# Altium footprint library PLC1.PcbLib: 118 footprints (part 5 of 8)
Each footprint in its own frame and in the unit in brackets; x right, y up, seen from the top. Pads: shape width x height; smd on the part's side, far side on the other; paste and mask are expansions set on the pad; w line width, h text height; cw(c..) or ccw(c..) is an arc to the next point about the centre after c.
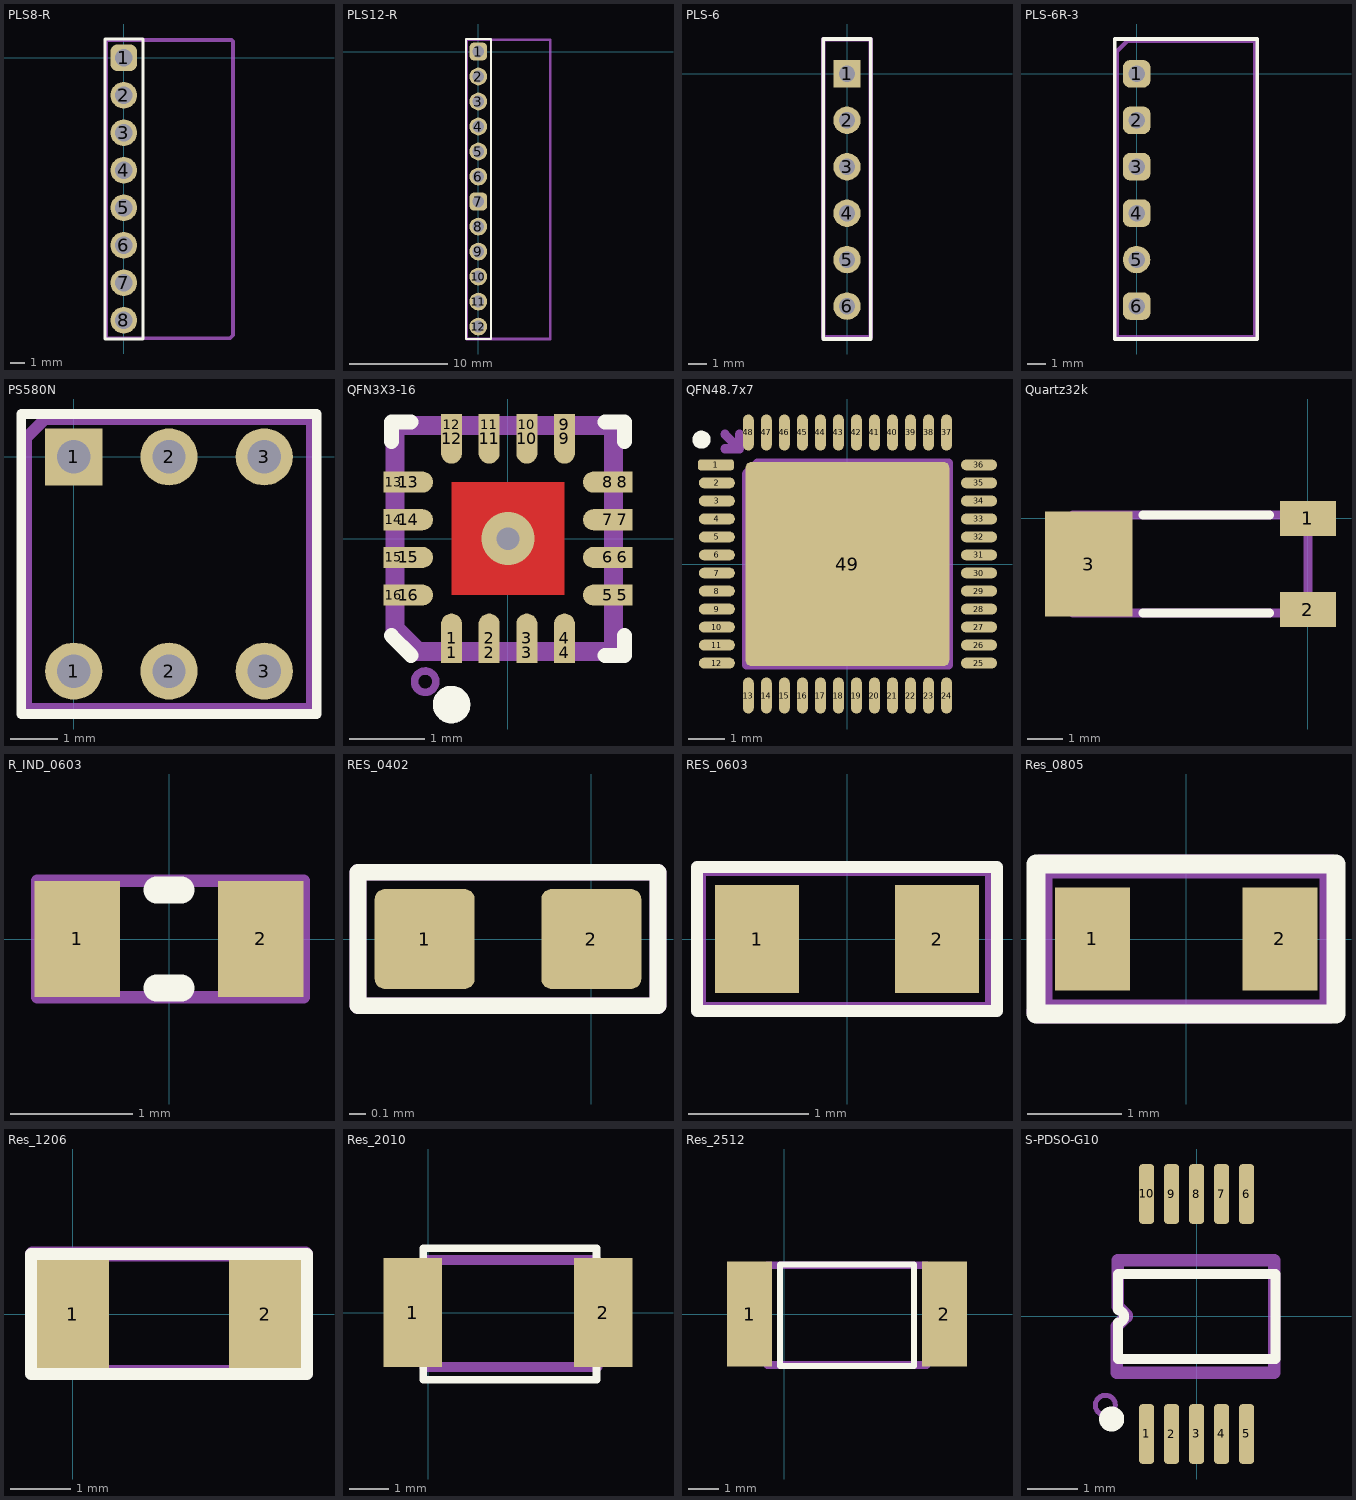
[diagram p4: the footprints below, top view; thin cyan lines are the x and y axes]

## PLS8-R [mm] "PLS8-R"
height 5
pads (8):
  rrect50% 1.8x1.8 hole 1.2: 1(0,0)
  round 1.8 hole 1.2: 2(0,-2.54) 3(0,-5.08) 4(0,-7.62) 5(0,-10.16) 6(0,-12.7) 7(0,-15.24) 8(0,-17.78)
Top Overlay:
  lines w0.2: -1.27,-19.05 1.3,-19.05 1.3,1.27 -1.27,1.27 -1.27,-19.05
Top Assy:
  lines w0.254: -1.2,-19 -1.2,1.2 7.3,1.2 7.4,1.1 7.4,-18.8 7.2,-19 -1.2,-19
  text ".Designator" at 0.3,-13.4 h0.7
3D body "User Library-PLS-1R.step": height 5.45, standoff -3, extent -1.27,-11.43 7.35,-8.89
3D body "User Library-PLS-1R.step": height 5.45, standoff -3, extent -1.27,-13.98 7.35,-11.44
3D body "User Library-PLS-1R.step": height 5.45, standoff -3, extent -1.27,-8.9 7.35,-6.36
3D body "User Library-PLS-1R.step": height 5.45, standoff -3, extent -1.27,-6.35 7.35,-3.81
3D body "User Library-PLS-1R.step": height 5.45, standoff -3, extent -1.27,-1.27 7.35,1.27
3D body "User Library-PLS-1R.step": height 5.45, standoff -3, extent -1.27,-3.82 7.35,-1.28
3D body "User Library-PLS-1R.step": height 5.45, standoff -3, extent -1.27,-19.06 7.35,-16.52
3D body "User Library-PLS-1R.step": height 5.45, standoff -3, extent -1.27,-16.51 7.35,-13.97

## PLS12-R [mm] "PLS12-R"
height 5
pads (12):
  rrect50% 1.8x1.8 hole 1.2: 1(0,0) 7(0,-15.24)
  round 1.8 hole 1.2: 2(0,-2.54) 3(0,-5.08) 4(0,-7.62) 5(0,-10.16) 6(0,-12.7) 8(0,-17.78) 9(0,-20.32) 10(0,-22.86) 11(0,-25.4) 12(0,-27.94)
Top Overlay:
  lines w0.2: -1.27,-29.2 1.3,-29.2 1.3,1.27 -1.27,1.27 -1.27,-29.2
Top Assy:
  lines w0.254: -1.2,-29.2 -1.2,1.2 7.3,1.2 7.3,-29.2 -1.2,-29.2
  text ".Designator" at 0.2,-9.3 h0.7
3D body "User Library-PLS-1R.step": height 5.45, standoff -3, extent -1.27,-11.43 7.35,-8.89
3D body "User Library-PLS-1R.step": height 5.45, standoff -3, extent -1.27,-13.98 7.35,-11.44
3D body "User Library-PLS-1R.step": height 5.45, standoff -3, extent -1.27,-8.9 7.35,-6.36
3D body "User Library-PLS-1R.step": height 5.45, standoff -3, extent -1.27,-6.35 7.35,-3.81
3D body "User Library-PLS-1R.step": height 5.45, standoff -3, extent -1.27,-1.27 7.35,1.27
3D body "User Library-PLS-1R.step": height 5.45, standoff -3, extent -1.27,-3.82 7.35,-1.28
3D body "User Library-PLS-1R.step": height 5.45, standoff -3, extent -1.27,-19.06 7.35,-16.52
3D body "User Library-PLS-1R.step": height 5.45, standoff -3, extent -1.27,-16.51 7.35,-13.97
3D body "User Library-PLS-1R.step": height 5.45, standoff -3, extent -1.27,-21.59 7.35,-19.05
3D body "User Library-PLS-1R.step": height 5.45, standoff -3, extent -1.27,-24.14 7.35,-21.6
3D body "User Library-PLS-1R.step": height 5.45, standoff -3, extent -1.27,-29.22 7.35,-26.68
3D body "User Library-PLS-1R.step": height 5.45, standoff -3, extent -1.27,-26.67 7.35,-24.13

## PLS-6 [mm] "PLS connector"
pads (6):
  rect 1.5x1.5 hole 0.9: 1(0,0)
  round 1.5 hole 0.9: 2(0,-2.54) 3(0,-5.08) 4(0,-7.62) 5(0,-10.16) 6(0,-12.7)
Top Overlay:
  lines w0.2: -1.3,-14.5 1.3,-14.5 1.3,-10.399 1.3,-2.196 1.3,1.905 -1.3,1.905 -1.3,-14.5
Top Assy:
  lines w0.254: -1.3,-14.4 1.3,-14.4 1.3,1.9 -1.3,1.9 -1.3,-14.4
  text ".Designator" at 0.5,-11.8 h0.7

## PLS-6R-3 [mm] "PLS connector"
pads (6):
  rrect50% 1.5x1.5 hole 0.9: 1(0,0) 2(0,-2.54) 3(0,-5.08) 4(0,-7.62) 6(0,-12.7)
  round 1.5 hole 0.9: 5(0,-10.16)
Top Overlay:
  lines w0.2: -1.2,-14.5 -1.2,1.905 6.6,1.905 6.6,-14.5 -1.2,-14.5
Top Assy:
  lines w0.254: -1.1,-14.4 6.5,-14.4 6.5,1.7 6.4,1.8 -0.5,1.8 -1.1,1.2 -1.1,-14.4
  text ".Designator" at 0.3,-9.9 h0.7

## PS580N [mm] "button"
pads (6):
  round 1.2 hole 0.7: 1(0,-4.5) 2(2,-4.5) 2(2,0) 3(4,-4.5) 3(4,0)
  rect 1.2x1.2 hole 0.7: 1(0,0)
Top Overlay:
  lines w0.2: -1.1,-5.4 -1.1,0.9 5.1,0.9 5.1,-5.4 -1.1,-5.4
Top Assy:
  lines w0.254: -1,-5.3 -1,0.4 -0.6,0.8 5,0.8 5,-5.3 -1,-5.3
  text ".Designator" at -0.4,-2.5 h0.7

## QFN3X3-16 [mm] "Quad Flat No Lead, Plastic; 16 Terminals; Body 3 x 3 mm; Pitch 0.5 mm"
height 0.8
pads (32):
  rect 0.28x0.28 smd: 1(-0.75,-1.515) 2(-0.25,-1.515) 3(0.25,-1.515) 4(0.75,-1.515) 5(1.515,-0.75) 6(1.515,-0.25) 7(1.515,0.25) 8(1.515,0.75) 9(0.75,1.515) 10(0.25,1.515) 11(-0.25,1.515) 12(-0.75,1.515) 13(-1.515,0.75) 14(-1.515,0.25) 15(-1.515,-0.25) 16(-1.515,-0.75)
  oval 0.28x0.66 smd: 1(-0.75,-1.325) 2(-0.25,-1.325) 3(0.25,-1.325) 4(0.75,-1.325) 9(0.75,1.325) 10(0.25,1.325) 11(-0.25,1.325) 12(-0.75,1.325)
  oval 0.66x0.28 smd: 5(1.325,-0.75) 6(1.325,-0.25) 7(1.325,0.25) 8(1.325,0.75) 13(-1.325,0.75) 14(-1.325,0.25) 15(-1.325,-0.25) 16(-1.325,-0.75)
via 0,0 diameter 0.7 hole 0.3
Top Layer:
  rectangle: -0.75,-0.75 0.75,0.75
Top Overlay:
  circle w0.25: c-0.75,-2.205 r0.125
  lines w0.2: -1.55,-1.29 -1.29,-1.55 ; -1.55,1.29 -1.55,1.55 -1.29,1.55 ; 1.29,-1.55 1.55,-1.55 1.55,-1.29 ; 1.29,1.55 1.55,1.55 1.55,1.29
Top Solder:
  region: -0.8,0.8 -0.8,-0.8 0.8,-0.8 0.8,0.8
Top Assy:
  circle w0.1: c-1.1,-1.9 r0.141
  lines w0.254: 1.4,-1.5 1.4,1.5 -1.5,1.5 -1.5,-1.2 -1.2,-1.5 1.5,-1.5
  text ".Designator" at -1.3,-0.3 h0.7
3D body "User Library-QFN-16_3x3.STEP": height 0.9, standoff 0, extent -1.524,-1.521 1.518,1.521

## QFN48.7x7 [mm] "48-Pin Thin Quad Flat Pack 0.5 mm Pitch, IPC Medium Density"
height 1.6
pads (49):
  rrect50% 1x0.3 smd: 1(-3.65,2.75)
  oval 1x0.3 smd: 2(-3.625,2.25) 3(-3.625,1.75) 4(-3.625,1.25) 5(-3.625,0.75) 6(-3.625,0.25) 7(-3.625,-0.25) 8(-3.625,-0.75) 9(-3.625,-1.25) 10(-3.625,-1.75) 11(-3.625,-2.25) 12(-3.625,-2.75) 25(3.65,-2.75) 26(3.65,-2.25) 27(3.65,-1.75) 28(3.65,-1.25) 29(3.65,-0.75) 30(3.65,-0.25) 31(3.65,0.25) 32(3.65,0.75) 33(3.65,1.25) 34(3.65,1.75) 35(3.65,2.25) 36(3.65,2.75)
  oval 0.3x1 smd: 13(-2.75,-3.65) 14(-2.25,-3.65) 15(-1.75,-3.65) 16(-1.25,-3.65) 17(-0.75,-3.65) 18(-0.25,-3.65) 19(0.25,-3.65) 20(0.75,-3.65) 21(1.25,-3.65) 22(1.75,-3.65) 23(2.25,-3.65) 24(2.75,-3.65) 37(2.75,3.65) 38(2.25,3.65) 39(1.75,3.65) 40(1.25,3.65) 41(0.75,3.65) 42(0.25,3.65) 43(-0.25,3.65) 44(-0.75,3.65) 45(-1.25,3.65) 46(-1.75,3.65) 47(-2.25,3.65) 48(-2.75,3.65)
  rrect5% 5.65x5.65 smd: 49(0,0)
Top Overlay:
  circle w0.25: c-4.05,3.45 r0.125
Top Assy:
  lines w0.254: -3.4,3.2 -3,3.2 ; -3.4,3.6 -3,3.2 ; -3,3.6 -3,3.2 ; -2.8,-2.8 -2.8,2.5 -2.5,2.8 2.8,2.8 2.8,-2.8 -2.8,-2.8
  text ".Designator" at -2.5,-0.2 h0.7
3D body "User Library-QFN48-1.STEP": height 0.83, standoff -0.02, extent -3.5,-3.505 3.51,3.5

## Quartz32k [mm] "Resonator 32kHz"
height 3
pads (3):
  rect 1.6x1 smd: 1(0,0) 2(0,-2.6)
  rect 2.5x3 smd: 3(-6.25,-1.3)
Top Overlay:
  lines w0.254: -4.7,-2.7 -1.1,-2.7 ; -4.7,0.1 -1.1,0.1
Top Assy:
  lines w0.254: -6.7,-2.7 -6.7,0.1 -0.1,0.1 0,0 0,-2.7 -6.7,-2.7
  text ".Designator" at -6.2,-1.6 h0.7

## R_IND_0603 [mm] "Chip, Body 1.6x0.85mm, IPC High Density"
height 0.8
pads (2):
  rect 0.7x0.95 smd mask+0.05: 1(-0.75,0) 2(0.75,0)
Top Overlay:
  lines w0.22: -0.1,-0.4 0.1,-0.4 ; -0.1,0.4 0.1,0.4
Top Assy:
  lines w0.1: -1.075,-0.475 0.075,-0.475 1.1,-0.475 1.1,0.475 -0.05,0.475 -1.075,0.475 -1.075,-0.475
  text ".Designator" at -0.95,-0.35 h0.7
3D body "RES0603.stp": height 0.45, standoff 0, extent -0.8,-0.4 0.8,0.4

## RES_0402 [mm] "RES and IND"
height 0.5
pads (2):
  rrect20% 0.6x0.6 smd: 1(-1,0) 2(0,0)
Top Overlay:
  lines w0.1: -1.4,-0.4 0.4,-0.4 0.4,0.4 -1.4,0.4 -1.4,-0.4
Top Assy:
  lines w0.1: -1.4,-0.4 0.4,-0.4 0.4,0.4 -1.4,0.4 -1.4,-0.4
  text ".Designator" at -1.3,-0.35 h0.7
3D body "User Library-res0402-1.step": height 0.3, standoff 0, extent -1,-0.25 0,0.25

## RES_0603 [mm] "RES and IND"
height 0.5
pads (2):
  rect 0.7x0.9 smd: 1(-0.75,0) 2(0.75,0)
Top Overlay:
  lines w0.1: -1.25,-0.6 -1.25,0.6 1.25,0.6 1.25,-0.6 -1.25,-0.6
Top Assy:
  lines w0.1: -1.225,-0.575 1.2,-0.575 1.2,0.575 -1.225,0.575 -1.225,-0.575
  text ".Designator" at -1.075,-0.35 h0.7
3D body "User Library-RES_1609-0603.STEP": height 0.56, standoff 0, extent -0.85,-0.4 0.85,0.4

## Res_0805 [mm]
pads (2):
  rect 0.8x1.1 smd: 1(-1,0) 2(1,0)
Top Overlay:
  lines w0.2: -1.6,-0.8 1.6,-0.8 1.6,0.8 -1.6,0.8 -1.6,-0.117 -1.6,-0.8
Top Assy:
  lines w0.254: 1.55,0.775 -1.55,0.775 -1.55,-0.75 -1.575,-0.775 1.525,-0.775 1.55,-0.75 1.55,0.775 ; 1.55,0.775 1.55,0.775
  text ".Designator" at -1.325,-0.4 h0.7
3D body "User Library-R_0805.step": height 0.5, standoff 0, extent -1,-0.625 1,0.625

## Res_1206 [mm]
pads (2):
  rect 1.2x1.8 smd: 1(0,0) 2(3.2,0)
Top Overlay:
  lines w0.2: -0.7,-1 3.9,-1 3.9,1 1.975,1 -0.7,1 -0.7,-1
Top Assy:
  lines w0.254: -0.675,-0.95 -0.675,1 3.875,1 3.875,-0.975 -0.65,-0.975 -0.675,-0.95
  text ".Designator" at -0.375,-0.375 h0.7
3D body "User Library-RES_3216-1206.step": height 0.85, standoff 0, extent -0.075,-0.865 3.275,0.865

## Res_2010 [mm] "2010"
height 2
pads (2):
  rect 1.5x2.8 smd: 1(-0.4,0) 2(4.5,0)
Top Overlay:
  lines w0.2: -0.125,-1.725 4.325,-1.725 4.325,1.65 2.625,1.65 -0.125,1.65 -0.125,-1.725
Top Assy:
  lines w0.254: -0.1,-1.4 -0.1,1.35 4.325,1.35 4.35,1.325 4.35,-1.4 -0.05,-1.4
  text ".Designator" at 0.175,-0.4 h0.7
3D body "User Library-R_2010.step": height 0.6, standoff 0, extent -0.5,-1.25 4.5,1.25

## Res_2512 [mm] "2512"
height 2
pads (2):
  rect 1.5x3.5 smd: 1(-1.15,0) 2(5.35,0)
Top Overlay:
  lines w0.2: -0.125,-1.725 4.325,-1.725 4.325,1.65 2.625,1.65 -0.125,1.65 -0.125,-1.725
Top Assy:
  lines w0.254: 4.75,1.625 -0.55,1.625 -0.55,-1.7 4.75,-1.7 4.75,1.625 ; 4.75,1.625 4.75,1.625
  text ".Designator" at 0.275,-0.15 h0.7
3D body "User Library-RESC6432X06.step": height 0.6, standoff 0, extent -1.075,-1.575 5.325,1.625

## S-PDSO-G10 [mm] "Shrink Small Outline; 10 Leads; Body Width 3 mm; Pitch 0.5 mm"
height 1.1
pads (10):
  rrect50% 0.3x1.2 smd: 1(-1,-2.35) 2(-0.5,-2.35) 3(0,-2.35) 4(0.5,-2.35) 5(1,-2.35) 6(1,2.45) 7(0.5,2.45) 8(0,2.45) 9(-0.5,2.45) 10(-1,2.45)
Top Overlay:
  circle w0.25: c-1.7,-2.05 r0.125
  lines w0.2: -1.575,-0.85 1.575,-0.85 1.575,0.85 -1.575,0.85 -1.575,0.125 cw(c-1.575,0) -1.575,-0.125 -1.575,-0.85
Top Assy:
  circle w0.1: c-1.825,-1.775 r0.2
  lines w0.254: -1.6,-1.125 1.55,-1.125 1.55,1.125 -1.55,1.125 -1.575,1.125 -1.575,0.2 -1.4,0.025 -1.4,0 -1.6,-0.2 -1.6,-1.125
  text ".Designator" at -1.25,-0.4 h0.7
3D body "User Library-TSSOP-10.step": height 1.1, standoff 0, extent -1.5,-2.5 1.5,2.5